# Altium footprint library Rising Clamp System WR-TBL_5.00 mm.PcbLib: 71 footprints (part 5 of 5)
Each footprint in its own frame and in the unit in brackets; x right, y up, seen from the top. Pads: shape width x height; smd on the part's side, far side on the other; paste and mask are expansions set on the pad; w line width, h text height; cw(c..) or ccw(c..) is an arc to the next point about the centre after c.
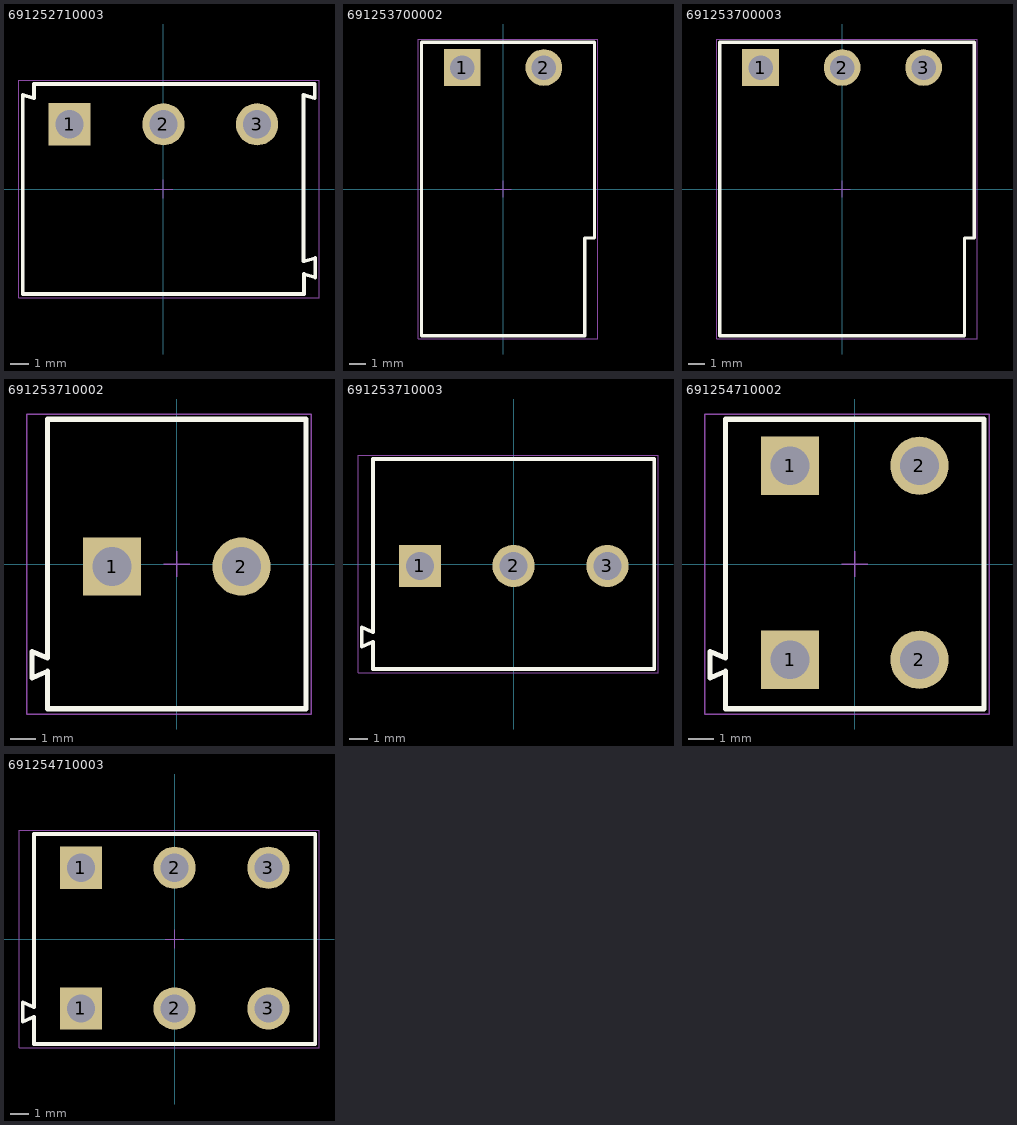
[diagram p4: the footprints below, top view; thin cyan lines are the x and y axes]

## 691252710003 [mm] "Serie 2527 - 5.00 mm _ 3 pins"
height 17.5
pads (3):
  rect 2.25x2.25 hole 1.5: 1(-5,3.45)
  round 2.25 hole 1.5: 2(0,3.45) 3(5,3.45)
Top Overlay:
  lines w0.2: 7.48,-3.86 7.48,5.01 8.08,4.84 8.08,5.6 -6.9,5.6 -6.9,4.84 -7.5,5.01 -7.5,-5.6 7.5,-5.6 7.5,-4.54 8.1,-4.715 8.1,-3.685 7.5,-3.86
M13 Assembly Top:
  lines w0.1: 7.48,-3.86 7.48,5.01 8.08,4.84 8.08,5.6 -6.9,5.6 -6.9,4.84 -7.5,5.01 -7.5,-5.6 7.5,-5.6 7.5,-4.54 8.1,-4.715 8.1,-3.685 7.5,-3.86
M15 Courtyard Top:
  lines w0.05: -0.5,0 0.5,0 ; 0,-0.5 0,0.5 ; -7.7,-5.8 -7.7,5.8 8.3,5.8 8.3,-5.8 -7.7,-5.8
3D body "691252710003.stp": height 17.6, standoff -2.9, extent -7.52,-5.6 8.08,5.6

## 691253700002 [mm] "Serie 2537 - 5.00 mm _ 2 pins"
height 18
pads (2):
  rect 2.25x2.25 hole 1.5: 1(-2.5,7.45)
  round 2.25 hole 1.5: 2(2.5,7.45)
Top Overlay:
  lines w0.2: -5,-9 5,-9 5,-3 5.6,-3 5.6,9 -5,9 -5,-9
M13 Assembly Top:
  lines w0.1: -5,-9 -5,9 5.6,9 5.6,-3 5,-3 5,-9 -5,-9
M15 Courtyard Top:
  lines w0.05: -0.5,0 0.5,0 ; 0,-0.5 0,0.5 ; -5.2,-9.2 5.8,-9.2 5.8,9.2 -5.2,9.2 -5.2,-9.2
3D body "691253700002.stp": height 11.3, standoff -3.9, extent -5,-9 5.6,9

## 691253700003 [mm] "Serie 2537 - 5.00 mm _ 3 pins"
height 18
pads (3):
  rect 2.25x2.25 hole 1.5: 1(-5,7.45)
  round 2.25 hole 1.5: 2(0,7.45) 3(5,7.45)
Top Overlay:
  lines w0.2: -7.5,-9 -7.5,9 8.1,9 8.1,-3 7.5,-3 7.5,-9 -7.5,-9
M13 Assembly Top:
  lines w0.1: -7.5,-9 7.5,-9 7.5,-3 8.1,-3 8.1,9 -7.5,9 -7.5,-9
M15 Courtyard Top:
  lines w0.05: -0.5,0 0.5,0 ; 0,-0.5 0,0.5 ; -7.7,-9.2 -7.7,9.2 8.3,9.2 8.3,-9.2 -7.7,-9.2
3D body "691253700003.stp": height 11.3, standoff -3.9, extent -7.5,-9 8.1,9

## 691253710002 [mm] "Serie 2537 - 5.00 mm _ 2 pins"
height 18
pads (2):
  rect 2.25x2.25 hole 1.5: 1(-2.5,-0.1)
  round 2.25 hole 1.5: 2(2.5,-0.1)
Top Overlay:
  lines w0.2: -5.6,-4.41 -5.6,-3.38 -5,-3.64 -5,5.6 5,5.6 5,-5.6 -5,-5.6 -5,-4.15 -5.6,-4.41
M13 Assembly Top:
  lines w0.1: -5.6,-4.41 -5,-4.15 -5,-5.6 5,-5.6 5,5.6 -5,5.6 -5,-3.64 -5.6,-3.38 -5.6,-4.41
M15 Courtyard Top:
  lines w0.05: -0.5,0 0.5,0 ; 0,-0.5 0,0.5 ; -5.8,-5.8 5.2,-5.8 5.2,5.8 -5.8,5.8 -5.8,-5.8
3D body "691253710002.stp": height 18.1, standoff -3.9, extent -5.6,-5.6 5,5.6

## 691253710003 [mm] "Serie 2537 - 5.00 mm _ 3 pins"
height 18
pads (3):
  rect 2.25x2.25 hole 1.5: 1(-5,-0.1)
  round 2.25 hole 1.5: 2(0,-0.1) 3(5,-0.1)
Top Overlay:
  lines w0.2: -8.1,-4.41 -7.5,-4.15 -7.5,-5.6 7.5,-5.6 7.5,5.6 -7.5,5.6 -7.5,-3.64 -8.1,-3.38 -8.1,-4.41
M13 Assembly Top:
  lines w0.1: -8.1,-4.41 -8.1,-3.38 -7.5,-3.64 -7.5,5.6 7.5,5.6 7.5,-5.6 -7.5,-5.6 -7.5,-4.15 -8.1,-4.41
M15 Courtyard Top:
  lines w0.05: -0.5,0 0.5,0 ; 0,-0.5 0,0.5 ; -8.3,-5.8 -8.3,5.8 7.7,5.8 7.7,-5.8 -8.3,-5.8
3D body "691253710003.stp": height 18.1, standoff -3.9, extent -8.1,-5.6 7.5,5.6

## 691254710002 [mm] "Serie 2547-5.00mm Horizontal Cable Entry with Rising Cage Clamp, 2 pins"
height 18
pads (4):
  rect 2.25x2.25 hole 1.5: 1(-2.5,-3.7) 1(-2.5,3.8)
  round 2.25 hole 1.5: 2(2.5,-3.7) 2(2.5,3.8)
Top Overlay:
  lines w0.2: -5.6,-4.41 -5.6,-3.38 -5,-3.64 -5,5.6 5,5.6 5,-5.6 -5,-5.6 -5,-4.15 -5.6,-4.41
M13 Assembly Top:
  lines w0.1: -5.6,-4.41 -5,-4.15 -5,-5.6 5,-5.6 5,5.6 -5,5.6 -5,-3.64 -5.6,-3.38 -5.6,-4.41
M15 Courtyard Top:
  lines w0.05: -0.5,0 0.5,0 ; 0,-0.5 0,0.5 ; -5.8,-5.8 5.2,-5.8 5.2,5.8 -5.8,5.8 -5.8,-5.8
3D body "691254710002.stp": height 18.05, standoff -3.45, extent -5.6,-5.6 5,5.6

## 691254710003 [mm] "Serie 2547-5.00mm Horizontal Cable Entry with Rising Cage Clamp, 3 pins"
height 18
pads (6):
  rect 2.25x2.25 hole 1.5: 1(-5,-3.7) 1(-5,3.8)
  round 2.25 hole 1.5: 2(0,-3.7) 2(0,3.8) 3(5,-3.7) 3(5,3.8)
Top Overlay:
  lines w0.2: -8.1,-4.41 -8.1,-3.38 -7.5,-3.64 -7.5,5.6 7.5,5.6 7.5,-5.6 -7.5,-5.6 -7.5,-4.15 -8.1,-4.41
M13 Assembly Top:
  lines w0.1: -8.1,-4.41 -7.5,-4.15 -7.5,-5.6 7.5,-5.6 7.5,5.6 -7.5,5.6 -7.5,-3.64 -8.1,-3.38 -8.1,-4.41
M15 Courtyard Top:
  lines w0.05: -0.5,0 0.5,0 ; 0,-0.5 0,0.5 ; -8.3,-5.8 7.7,-5.8 7.7,5.8 -8.3,5.8 -8.3,-5.8
3D body "691254710003.stp": height 18.05, standoff -3.45, extent -8.1,-5.6 7.5,5.6